# Altium footprint library Footprints_SOC.PcbLib: 197 footprints (part 9 of 13)
Each footprint in its own frame and in the unit in brackets; x right, y up, seen from the top. Pads: shape width x height; smd on the part's side, far side on the other; paste and mask are expansions set on the pad; w line width, h text height; cw(c..) or ccw(c..) is an arc to the next point about the centre after c.
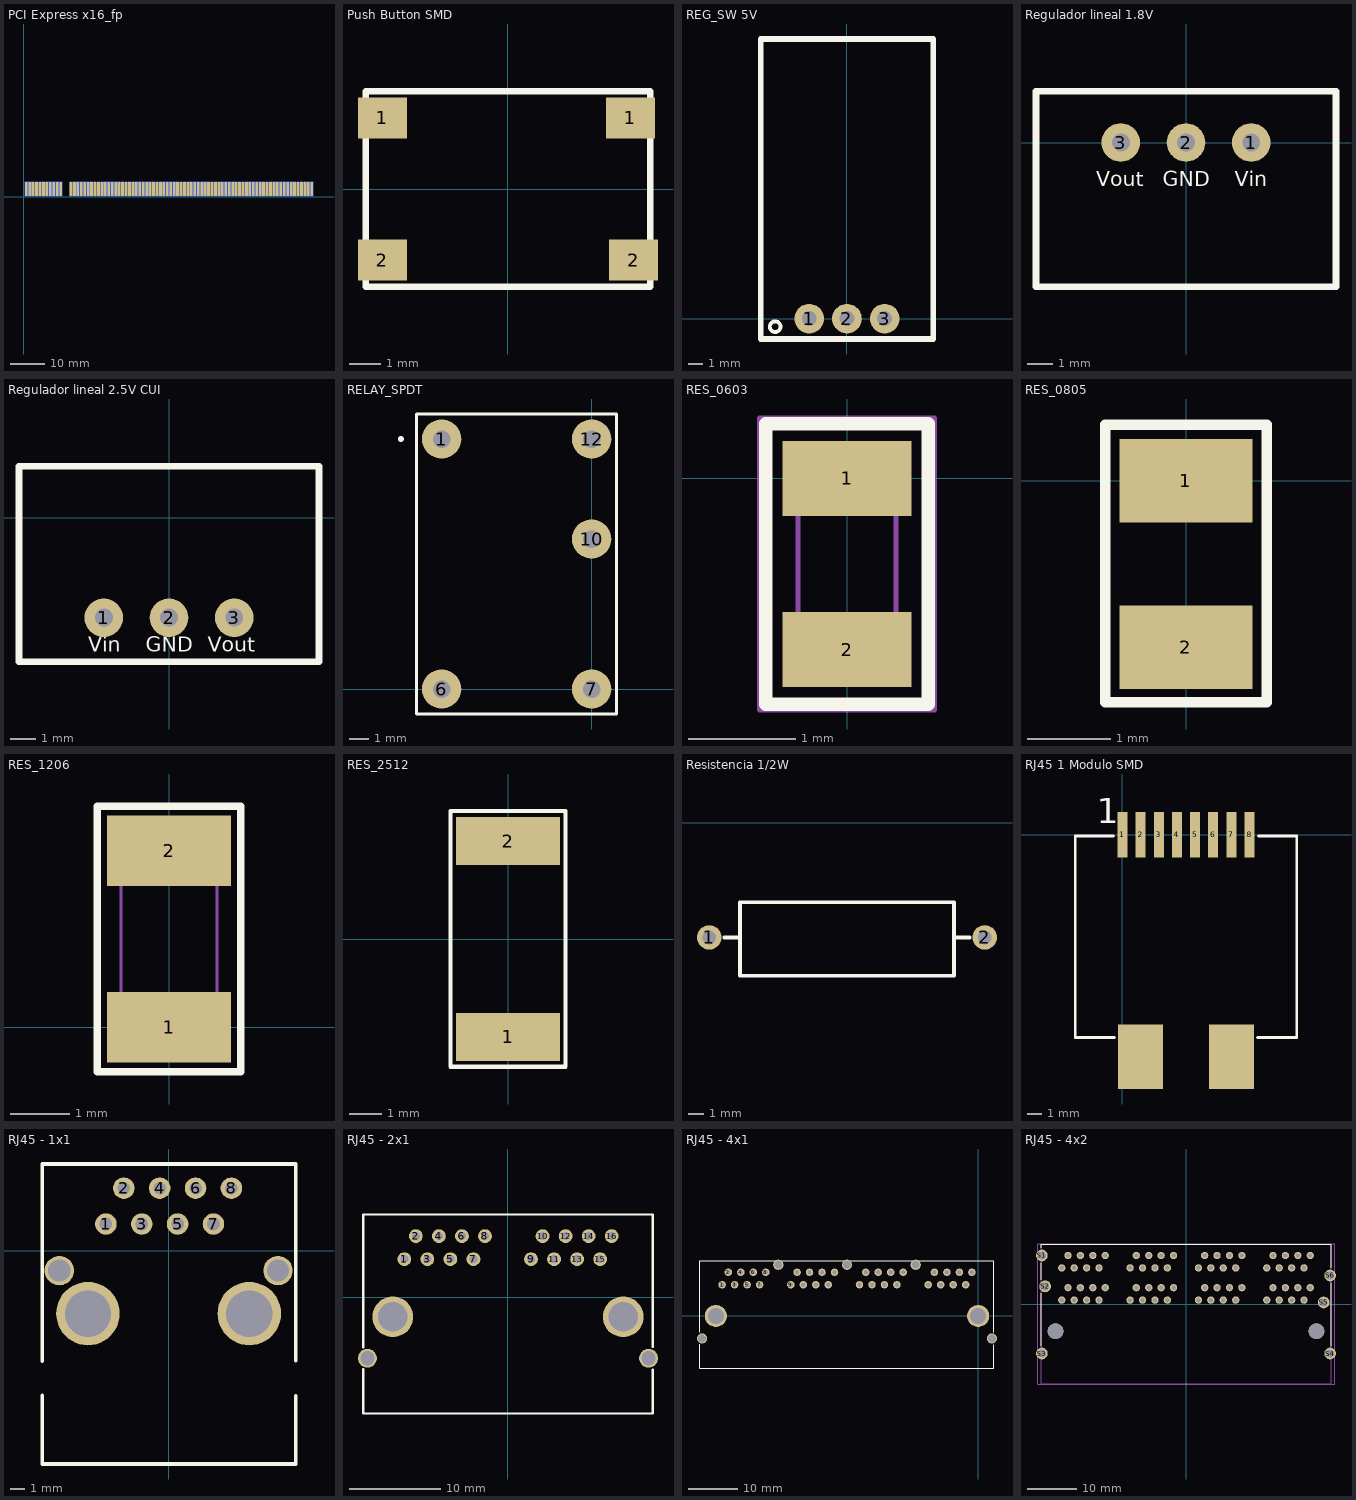
[diagram p8: the footprints below, top view; thin cyan lines are the x and y axes]

## PCI Express x16_fp [mm]
pads (164):
  rect 0.8x4.2 smd: 1(0.75,2.25) 3(1.75,2.25) 5(2.75,2.25) 7(3.75,2.25) 9(4.75,2.25) 11(5.75,2.25) 13(6.75,2.25) 15(7.75,2.25) 17(8.75,2.25) 19(9.75,2.25) 21(10.75,2.25) 23(13.75,2.25) 25(14.75,2.25) 27(15.75,2.25) 29(16.75,2.25) 31(17.75,2.25) 33(18.75,2.25) 35(19.75,2.25) 37(20.75,2.25) 39(21.75,2.25) 41(22.75,2.25) 43(23.75,2.25) 45(24.75,2.25) 47(25.75,2.25) 49(26.75,2.25) 51(27.75,2.25) 53(28.75,2.25) 55(29.75,2.25) 57(30.75,2.25) 59(31.75,2.25) 61(32.75,2.25) 63(33.75,2.25) 65(34.75,2.25) 67(35.75,2.25) 69(36.75,2.25) 71(37.75,2.25) 73(38.75,2.25) 75(39.75,2.25) 77(40.75,2.25) 79(41.75,2.25) 81(42.75,2.25) 83(43.75,2.25) 85(44.75,2.25) 87(45.75,2.25) 89(46.75,2.25) 91(47.75,2.25) 93(48.75,2.25) 95(49.75,2.25) 97(50.75,2.25) 99(51.75,2.25) 101(52.75,2.25) 103(53.75,2.25) 105(54.75,2.25) 107(55.75,2.25) 109(56.75,2.25) 111(57.75,2.25) 113(58.75,2.25) 115(59.75,2.25) 117(60.75,2.25) 119(61.75,2.25) 121(62.75,2.25) 123(63.75,2.25) 125(64.75,2.25) 127(65.75,2.25) 129(66.75,2.25) 131(67.75,2.25) 133(68.75,2.25) 135(69.75,2.25) 137(70.75,2.25) 139(71.75,2.25) 141(72.75,2.25) 143(73.75,2.25) 145(74.75,2.25) 147(75.75,2.25) 149(76.75,2.25) 151(77.75,2.25) 153(78.75,2.25) 155(79.75,2.25) 157(80.75,2.25) 159(81.75,2.25) 161(82.75,2.25) 163(83.75,2.25)
  rect 0.8x4.2 smd far side: 2(0.75,2.25) 4(1.75,2.25) 6(2.75,2.25) 8(3.75,2.25) 10(4.75,2.25) 12(5.75,2.25) 14(6.75,2.25) 16(7.75,2.25) 18(8.75,2.25) 20(9.75,2.25) 22(10.75,2.25) 24(13.75,2.25) 26(14.75,2.25) 28(15.75,2.25) 30(16.75,2.25) 32(17.75,2.25) 34(18.75,2.25) 36(19.75,2.25) 38(20.75,2.25) 40(21.75,2.25) 42(22.75,2.25) 44(23.75,2.25) 46(24.75,2.25) 48(25.75,2.25) 50(26.75,2.25) 52(27.75,2.25) 54(28.75,2.25) 56(29.75,2.25) 58(30.75,2.25) 60(31.75,2.25) 62(32.75,2.25) 64(33.75,2.25) 66(34.75,2.25) 68(35.75,2.25) 70(36.75,2.25) 72(37.75,2.25) 74(38.75,2.25) 76(39.75,2.25) 78(40.75,2.25) 80(41.75,2.25) 82(42.75,2.25) 84(43.75,2.25) 86(44.75,2.25) 88(45.75,2.25) 90(46.75,2.25) 92(47.75,2.25) 94(48.75,2.25) 96(49.75,2.25) 98(50.75,2.25) 100(51.75,2.25) 102(52.75,2.25) 104(53.75,2.25) 106(54.75,2.25) 108(55.75,2.25) 110(56.75,2.25) 112(57.75,2.25) 114(58.75,2.25) 116(59.75,2.25) 118(60.75,2.25) 120(61.75,2.25) 122(62.75,2.25) 124(63.75,2.25) 126(64.75,2.25) 128(65.75,2.25) 130(66.75,2.25) 132(67.75,2.25) 134(68.75,2.25) 136(69.75,2.25) 138(70.75,2.25) 140(71.75,2.25) 142(72.75,2.25) 144(73.75,2.25) 146(74.75,2.25) 148(75.75,2.25) 150(76.75,2.25) 152(77.75,2.25) 154(78.75,2.25) 156(79.75,2.25) 158(80.75,2.25) 160(81.75,2.25) 162(82.75,2.25) 164(83.75,2.25)

## Push Button SMD [mm] "Wurth 6.2x6.2mm P/N: 430152095836"
pads (4):
  rect 1.55x1.3 smd: 1(-3.975,2.25) 1(3.873,2.25) 2(-3.975,-2.25) 2(3.975,-2.25)
Top Overlay:
  lines w0.2: -4.5,-3.1 4.5,-3.1 4.5,3.1 -4.5,3.1 -4.5,-3.1
3D body "push botton Wurth (430152095836).stp": height 9.5, standoff 0, extent -4.5,-3.1 4.5,3.1

## REG_SW 5V [mm] "DC/DC Converter P/N: V7805-2000R"
pads (3):
  round 2 hole 1: 1(-2.54,0) 2(0,0) 3(2.54,0)
Top Overlay:
  circle w0.254: c-4.83,-0.54 r0.359
  lines w0.381: -5.796,-1.37 5.804,-1.37 5.804,18.82 -5.796,18.82 -5.796,-1.37
3D body "CUI_V7805-2000R.step": height 9.5, standoff -3.6, extent -5.8,-0.1 5.7,18.9

## Regulador lineal 1.8V [mm]
pads (3):
  round 1.5 hole 0.7: 1(2.54,0) 2(0,0) 3(-2.54,0)
Top Overlay:
  lines w0.254: -5.84,-5.62 5.84,-5.62 5.84,2 -5.84,2 -5.84,-5.62
  text "Vout" at -3.5,-1.889 h1
  text "Vin" at 1.9,-1.889 h1
  text "GND" at -0.9,-1.9 h1

## Regulador lineal 2.5V CUI [mm] "CONVERT DC/DC 0.5A 2.5V OUT"
pads (3):
  round 1.5 hole 0.7: 1(-2.54,-3.9) 2(0,-3.9) 3(2.54,-3.9)
Top Overlay:
  lines w0.254: -5.84,-5.62 -5.84,2 5.84,2 5.84,-5.62 -5.84,-5.62
  text "GND" at -0.9,-5.418 h1
  text "Vout" at 1.5,-5.42 h1
  text "Vin" at -3.15,-5.43 h1
3D body "CUI_P7805-Q12-S2-S (reg lineal 2.5V).step": height 10.3, standoff -4, extent -5.78,-5.66 5.82,1.84

## RELAY_SPDT [mm] "P/N: DS1E-M-DC12V"
pads (5):
  round 2 / inner round 1.397 / far side round 1.397 hole 0.889 mask+0: 1(-7.62,12.7) 6(-7.62,0) 7(0,0) 10(0,7.62) 12(0,12.7)
Top Overlay:
  circle w0.152: c-9.69,12.7 r0.076
  lines w0.152: -8.89,-1.27 -8.89,13.97 1.27,13.97 1.27,-1.27 -8.89,-1.27
3D body: height 0.25, standoff 0, extent 0,0 0.254,0.254
3D body "RELAY_SPDT Part-Number DS1E-M-DC12V.step": height 9.91, standoff -2.54, extent -8.763,-1.143 1.143,13.843

## RES_0603 [mm] "RES 0603"
pads (2):
  rect 1.2x0.7 smd: 1(0,0) 2(0,-1.6)
Top Overlay:
  lines w0.127: -0.76,-2.11 0.76,-2.11 0.76,0.51 -0.76,0.51 -0.76,-2.11
Mechanical 3:
  lines w0.051: -0.457,-1.6 -0.457,0.025 0.457,0.025 0.457,-1.6 -0.457,-1.6
Mechanical 5:
  lines w0.051: -0.813,-2.159 -0.813,0.559 0.813,0.559 0.813,-2.159 -0.813,-2.159
  text ".Designator" at 0.28,-2.031 h0.76
Mechanical 15:
  lines w0.051: -0.813,-2.159 0.813,-2.159 0.813,0.559 -0.813,0.559 -0.813,-2.159
3D body "Resistencia 0603.step": height 0.5, standoff 0, extent -0.45,-1.59 0.45,0.01

## RES_0805 [mm] "RES 0805"
pads (2):
  rect 1.6x1 smd: 1(0,0) 2(0,-2)
Top Overlay:
  lines w0.127: -0.97,-2.66 -0.97,0.67 0.97,0.67 0.97,-2.66 -0.97,-2.66
3D body "Resistencia 0805.step": height 0.5, standoff 0, extent -0.61,-2 0.64,0

## RES_1206 [mm] "RES 1206"
pads (2):
  rect 2.1x1.2 smd: 1(0,0) 2(0,3)
Top Overlay:
  lines w0.127: -1.22,-0.76 -1.22,3.76 1.22,3.76 1.22,-0.76 -1.22,-0.76
Mechanical 3:
  lines w0.051: -0.813,-0.076 0.813,-0.076 0.813,3.15 -0.813,3.15 -0.813,-0.076
Mechanical 5:
  lines w0.051: -1.245,-0.762 -1.245,3.785 1.219,3.785 1.245,3.785 1.245,-0.762 -1.245,-0.762
  text ".Designator" at 0.483,-0.533 h1.52
3D body "Resistencia 1206.step": height 0.6, standoff 0, extent -0.8,-0.076 0.8,3.124

## RES_2512 [mm] "RES 2512"
pads (2):
  rect 3.2x1.475 smd: 1(0,-3.012) 2(0,3.013)
Top Overlay:
  lines w0.127: -1.77,-3.93 -1.77,3.94 1.76,3.94 1.76,-3.93 -1.77,-3.93
3D body "resistencia 2512.stp": height 0.67, standoff 0.03, extent -1.588,-3.175 1.587,3.175

## Resistencia 1/2W [mm] "Through Hole"
pads (2):
  round 1.6 hole 0.9: 1(-27.5,-7.5) 2(-9.5,-7.5)
Top Overlay:
  lines w0.254: -26.5,-7.5 -25.5,-7.5 ; -11.5,-7.5 -10.5,-7.5 ; -25.5,-10 -11.5,-10 -11.5,-5.2 -25.5,-5.2 -25.5,-10
3D body "Resistencia 0.5W.STEP": height 4.72, standoff -2.67, extent -27.771,-9.97 -9.286,-5.19

## RJ45 1 Modulo SMD [mm] "smd WURTH"
height 27
pads (10):
  rect 0.7x3.2 smd: 1(0,0) 2(1.27,0) 3(2.54,0) 4(3.81,0) 5(5.08,0) 6(6.35,0) 7(7.62,0) 8(8.89,0)
  rect 3.15x4.5 smd: ""(1.27,-15.55) ""(7.62,-15.55)
Top Overlay:
  lines w0.2: -0.62,-0.1 -3.31,-0.1 -3.31,-14.2 -0.56,-14.2 ; 9.45,-14.2 12.2,-14.2 12.2,-0.1 9.51,-0.1
  text "1" at -1.8,0.2 h3
3D body "RJ-45 1 MODULO SMD.stp": height 12.7, standoff 0, extent -3.32,-16.64 12.23,1.36

## RJ45 - 1x1 [mil] "1 conector RJ-45"
height 1062.99
pads (12):
  round 60 hole 35: 1(-175,75) 2(-125,175) 3(-75,75) 4(-25,175) 5(25,75) 6(75,175) 7(125,75) 8(175,175)
  round 82 hole 62: ""(-304.92,-54.92) ""(304.92,-54.92)
  round 177.17 hole 129: ""(-225,-175) ""(225,-175)
Top Overlay:
  lines w10: -353,-403 -353,-594.29 354.92,-594.29 354.92,-404 ; -353,-307 -353,242.35 354.92,242.35 354.92,-306
3D body "RJ-45 modulo horizontal.stp": height 580.59, standoff -145.41, extent -345.63,-597.65 352.55,242.35

## RJ45 - 2x1 [mil] "2 conectores RJ-45"
height 1062.99
pads (20):
  round 60 hole 35: 1(-450,164.96) 2(-400,264.96) 3(-350,164.96) 4(-300,264.96) 5(-250,164.96) 6(-200,264.96) 7(-150,164.96) 8(-100,264.96) 9(100,164.96) 10(150,264.96) 11(200,164.96) 12(250,264.96) 13(300,164.96) 14(350,264.96) 15(400,164.96) 16(450,264.96)
  round 82 hole 62: ""(-609.84,-264.96) ""(609.84,-264.96)
  round 177.17 hole 129: ""(-500,-85.04) ""(500,-85.04)
Top Overlay:
  lines w10: -628,-313.04 -628,-504.33 627.99,-504.33 627.99,-314.04 ; -628,-217.04 -628,358.66 627.99,358.66 627.99,-216.04
3D body "rj-45 2x1.stp": height 577.84, standoff -150.41, extent -648.69,-508.5 654.2,331.5

## RJ45 - 4x1 [mil] "4 conectores RJ-45"
height 1062.99
pads (39):
  round 60 hole 35: 1(-2050,250) 2(-2000,350) 3(-1950,250) 4(-1900,350) 5(-1850,250) 6(-1800,350) 7(-1750,250) 8(-1700,350) 9(-1500,250) 10(-1450,350) 11(-1400,250) 12(-1350,350) 13(-1300,250) 14(-1250,350) 15(-1200,250) 16(-1150,350) 17(-950,250) 18(-900,350) 19(-850,250) 20(-800,350) 21(-750,250) 22(-700,350) 23(-650,250) 24(-600,350) 25(-400,250) 26(-350,350) 27(-300,250) 28(-250,350) 29(-200,250) 30(-150,350) 31(-100,250) 32(-50,350)
  round 82 hole 62: ""(-2210,-180) ""(-1600,409.84) ""(-1050,409.84) ""(-500,409.84) ""(110,-180)
  round 177.17 hole 129: ""(-2100,0) ""(0,0)
Top Overlay:
  lines w10: -2228,-228 -2228,-419.29 126,-419.29 126,-229 ; -2228,-132 -2228,443.7 124.82,443.7 126,442.52 126,-131
3D body "rj-45 4x1.stp": height 592.9, standoff -145.71, extent -2261.42,-421.54 164.71,442.01

## RJ45 - 4x2 [mm] "P/N: 1-1734715-2"
height 27
pads (72):
  round 1.5 hole 0.9: A1(-25.4,0.902) A2(-24.13,3.442) A3(-22.86,0.902) A4(-21.59,3.442) A5(-20.32,0.902) A6(-19.05,3.442) A7(-17.78,0.902) A8(-16.51,3.442) B1(-11.43,0.902) B2(-10.16,3.442) B3(-8.89,0.902) B4(-7.62,3.442) B5(-6.35,0.902) B6(-5.08,3.442) B7(-3.81,0.902) B8(-2.54,3.442) C1(2.54,0.902) C2(3.81,3.442) C3(5.08,0.902) C4(6.35,3.442) C5(7.62,0.902) C6(8.89,3.442) C7(10.16,0.902) C8(11.43,3.442) D1(16.51,0.902) D2(17.78,3.442) D3(19.05,0.902) D4(20.32,3.442) D5(21.59,0.902) D6(22.86,3.442) D7(24.13,0.902) D8(25.4,3.442) E1(25.4,10.02) E2(24.13,7.48) E3(22.86,10.02) E4(21.59,7.48) E5(20.32,10.02) E6(19.05,7.48) E7(17.78,10.02) E8(16.51,7.48) F1(11.43,10.02) F2(10.16,7.48) F3(8.89,10.02) F4(7.62,7.48) F5(6.35,10.02) F6(5.08,7.48) F7(3.81,10.02) F8(2.54,7.48) G1(-2.54,10.02) G2(-3.81,7.48) G3(-5.08,10.02) G4(-6.35,7.48) G5(-7.62,10.02) G6(-8.89,7.48) G7(-10.16,10.02) G8(-11.43,7.48) H1(-16.51,10.02) H2(-17.78,7.48) H3(-19.05,10.02) H4(-20.32,7.48) H5(-21.59,10.02) H6(-22.86,7.48) H7(-24.13,10.02) H8(-25.4,7.48)
  round 2.4 hole 1.6: S1(-29.464,10.02) S2(-28.804,3.696) S3(-29.464,-10.02) S4(29.464,-10.02) S5(28.143,0.419) S6(29.464,5.931)
  round 3.2 hole 3.2 unplated: ""(-26.67,-5.448) ""(26.67,-5.448)
Top Overlay:
  lines w0.254: -29.591,-8.509 -29.591,2.286 ; -29.591,5.08 -29.591,8.509 ; -29.572,11.557 -29.572,12.352 29.678,12.352 29.678,7.493 ; 29.678,-8.509 29.678,4.445
Mechanical 3:
  lines w0.051: -30.277,-16.256 -30.277,12.37 30.378,12.37 30.378,-16.256 -30.277,-16.256
Mechanical 5:
  lines w0.127: -29.591,-16.205 -29.591,12.319 29.667,12.319 29.667,-16.205 -29.591,-16.205
  text "1" at -25.629,-1.803 h1.52
  text ".Designator" at -13.081,-6.926 h2.54
3D body "rj-45 4x2 horizontal (1-1734715-2).stp": height 27.35, standoff -2.43, extent -30.27,-16.248 30.377,12.352